# Altium footprint library Cty1.PcbLib: 1378 footprints (part 87 of 87)
Each footprint in its own frame and in the unit in brackets; x right, y up, seen from the top. Pads: shape width x height; smd on the part's side, far side on the other; paste and mask are expansions set on the pad; w line width, h text height; cw(c..) or ccw(c..) is an arc to the next point about the centre after c.
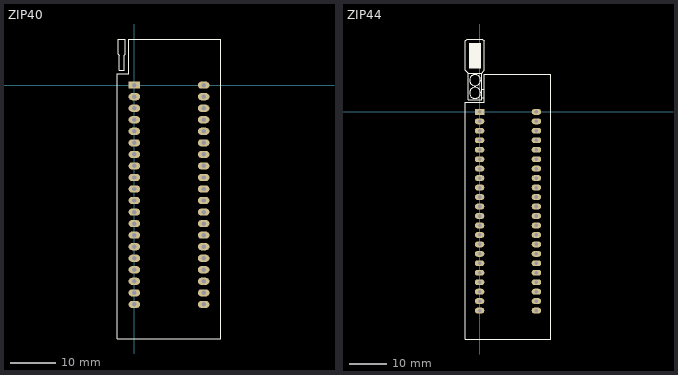
[diagram p86: the footprints below, top view; thin cyan lines are the x and y axes]

## ZIP40 [mil] "40 PIN, W 900 mil , L 2600 mil , Push Pro FOR Chip"
height 300
pads (40):
  rect 100x62 hole 38: 1(0,0)
  oval 100x62 hole 38: 2(0,-100) 3(0,-200) 4(0,-300) 5(0,-400) 6(0,-500) 7(0,-600) 8(0,-700) 9(0,-800) 10(0,-900) 11(0,-1000) 12(0,-1100) 13(0,-1200) 14(0,-1300) 15(0,-1400) 16(0,-1500) 17(0,-1600) 18(0,-1700) 19(0,-1800) 20(0,-1900) 21(600,-1900) 22(600,-1800) 23(600,-1700) 24(600,-1600) 25(600,-1500) 26(600,-1400) 27(600,-1300) 28(600,-1200) 29(600,-1100) 30(600,-1000) 31(600,-900) 32(600,-800) 33(600,-700) 34(600,-600) 35(600,-500) 36(600,-400) 37(600,-300) 38(600,-200) 39(600,-100) 40(600,0)
Top Overlay:
  lines w7: -150,100 -150,-2200 750,-2200 750,400 600,400 50,400
  lines w7.01: -150,100 -50,100 -50,400 50,400 ; -140,270 -140,400 -80,400 -80,270 -90,260 -90,130 -110,130 -130,130 -130,260 -140,270
3D body "SW3dPS-zif.STEP": height 443.07, standoff -186.85, extent -189.6,-2144.51 750,894.51

## ZIP44 [mil] "40 PIN, W 900 mil , L 2600 mil , Push Pro FOR Chip"
height 300
pads (44):
  rect 100x62 hole 38: 1(0,0)
  oval 100x62 hole 38: 2(0,-100) 3(0,-200) 4(0,-300) 5(0,-400) 6(0,-500) 7(0,-600) 8(0,-700) 9(0,-800) 10(0,-900) 11(0,-1000) 12(0,-1100) 13(0,-1200) 14(0,-1300) 15(0,-1400) 16(0,-1500) 17(0,-1600) 18(0,-1700) 19(0,-1800) 20(0,-1900) 21(0,-2000) 22(0,-2100) 23(600,-2100) 24(600,-2000) 25(600,-1900) 26(600,-1800) 27(600,-1700) 28(600,-1600) 29(600,-1500) 30(600,-1400) 31(600,-1300) 32(600,-1200) 33(600,-1100) 34(600,-1000) 35(600,-900) 36(600,-800) 37(600,-700) 38(600,-600) 39(600,-500) 40(600,-400) 41(600,-300) 42(600,-200) 43(600,-100) 44(600,0)
Top Overlay:
  circle w7: c-48.31,335 r58.31
  circle w7: c-48.31,200 r58.31
  rectangle: -110,460 15,730
  lines w7: 20,150 50,150 ; 20,240 50,240 ; -120,410 -120,130 -110,130 20,130 20,410 ; -120,410 -150,440 -150,750 -130,770 30,770 50,750 50,440 20,410 ; -120,410 20,410 ; -150,-2400 -150,100 50,100 50,400 600,400 750,400 750,-2400 -150,-2400